# Altium footprint library PIFWRobot.PcbLib: 18 footprints (part 1 of 2)
Each footprint in its own frame and in the unit in brackets; x right, y up, seen from the top. Pads: shape width x height; smd on the part's side, far side on the other; paste and mask are expansions set on the pad; w line width, h text height; cw(c..) or ccw(c..) is an arc to the next point about the centre after c.
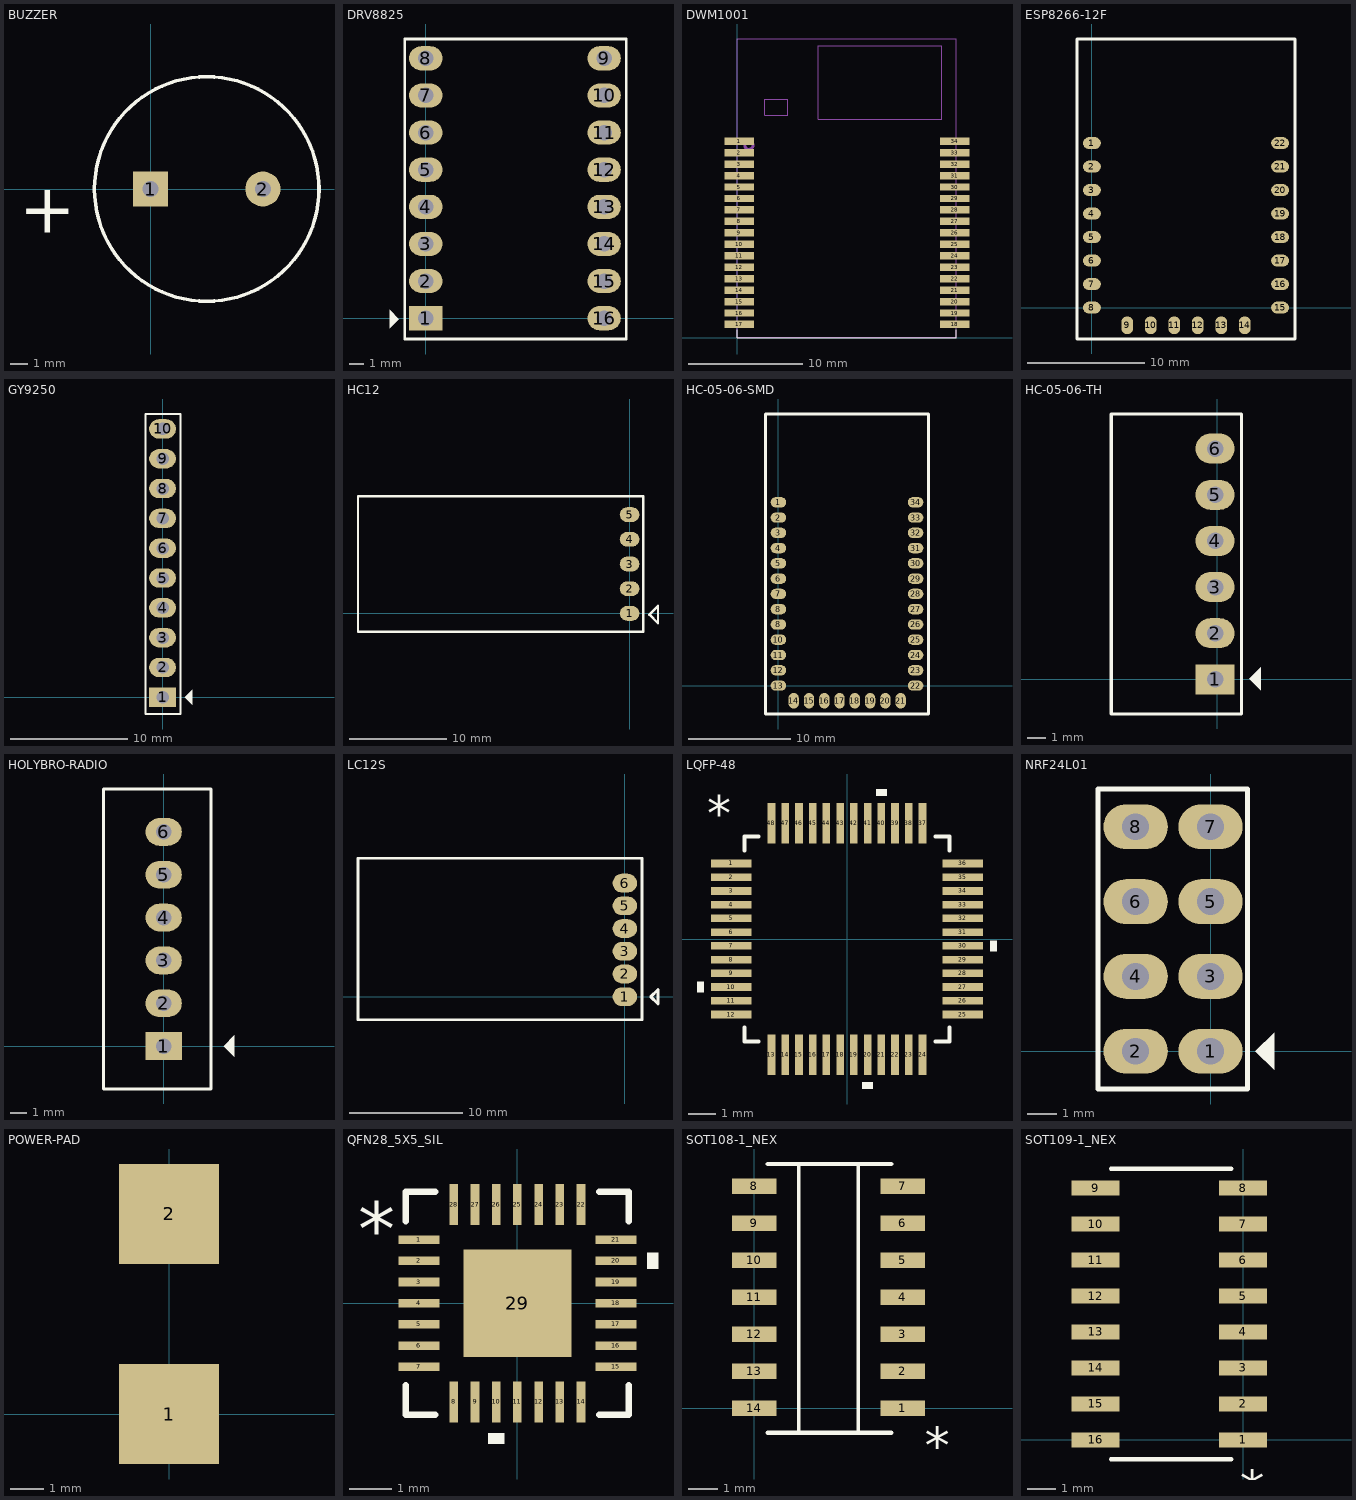
[diagram p0: the footprints below, top view; thin cyan lines are the x and y axes]

## BUZZER [mil]
pads (2):
  rect 80x80 hole 36: 1(0,0)
  round 80 hole 36: 2(255.91,0)
Top Overlay:
  circle w8: c127.95,0 r255.91
  text "+" at -300,-100 h112.5
3D body "Altavoz.STEP": height 225.91, standoff -400.08, extent -108.27,-233.27 358.27,233.27

## DRV8825 [mil]
pads (16):
  rect 90x65 hole 42: 1(0,0)
  oval 90x65 hole 42: 2(0,100) 3(0,200) 4(0,300) 5(0,400) 6(0,500) 7(0,600) 8(0,700) 9(480,700) 10(480,600) 11(480,500) 12(480,400) 13(480,300) 14(480,200) 15(480,100) 16(480,0)
Top Overlay:
  region: -72.5,-2.5 -97.5,22.5 -97.5,-27.5
  lines w7: 423,-56 540,-56 ; 540,-56 540,752 -57,752 -57,-56 540,-56
3D body "Driver DRV8825.stp": height 544.09, standoff -36.36, extent -55.28,-52.64 535.27,747.36

## DWM1001 [mm] "DWM1001 MODULE"
height 4
pads (34):
  rect 2.54x0.65 smd: 1(0.16,17.15) 2(0.16,16.15) 3(0.16,15.15) 4(0.16,14.15) 5(0.16,13.15) 6(0.16,12.15) 7(0.16,11.15) 8(0.16,10.15) 9(0.16,9.15) 10(0.16,8.15) 11(0.16,7.15) 12(0.16,6.15) 13(0.16,5.15) 14(0.16,4.15) 15(0.16,3.15) 16(0.16,2.15) 17(0.16,1.15) 18(18.97,1.15) 19(18.97,2.15) 20(18.97,3.15) 21(18.97,4.15) 22(18.97,5.15) 23(18.97,6.15) 24(18.97,7.15) 25(18.97,8.15) 26(18.97,9.15) 27(18.97,10.15) 28(18.97,11.15) 29(18.97,12.15) 30(18.97,13.15) 31(18.97,14.15) 32(18.97,15.15) 33(18.97,16.15) 34(18.97,17.15)
Top Overlay:
  lines w0.1: 0,0.7 0,0 19.1,0 19.1,0.7
Mechanical 1:
  lines w0.1: 0,0 0,26.075 19.1,26.075 19.1,0.025 0,0.025 0,0.9
Mechanical 16:
  circle w0.254: c1,16.8 r0.361
  lines w0.1: 0,0.025 0,26.075 19.1,26.075 19.1,0.025 0,0.025 ; 2.4,19.4 2.4,20.8 4.4,20.8 4.4,19.4 2.4,19.4 ; 7.075,19.05 7.075,25.475 17.85,25.475 17.85,19.05 7.075,19.05
Mechanical 29:
  text ".Designator" at 5.6,11.6 h0.8
3D body "dm1_b2_V2.step": height 4.6, standoff 0.03, extent 0,0 19.125,26.125

## ESP8266-12F [mil]
pads (22):
  oval 60x40 smd: 1(0,551.18) 2(0,472.44) 3(0,393.7) 4(0,314.96) 5(0,236.22) 6(0,157.48) 7(0,78.74) 8(0,0) 15(630,0) 16(630,78.74) 17(630,157.48) 18(630,236.22) 19(630,314.96) 20(630,393.7) 21(630,472.44) 22(630,551.18)
  oval 40x60 smd: 9(118.11,-59.06) 10(196.85,-59.06) 11(275.59,-59.06) 12(354.33,-59.06) 13(433.07,-59.06) 14(511.81,-59.06)
Top Overlay:
  lines w10: -50,-105 -50,900 680,900 680,-105 -50,-105
3D body "User Library-EPS8266 ESP-12E-1.STEP": height 104.33, standoff -1.38, extent -0.16,-60 630.16,885.08

## GY9250 [mil] "GY9250"
height 200
pads (10):
  rect 90x65 hole 42: 1(0,0)
  oval 90x65 hole 42: 2(0,100) 3(0,200) 4(0,300) 5(0,400) 6(0,500) 7(0,600) 8(0,700) 9(0,800) 10(0,900)
Top Overlay:
  region: 75,0 100,-25 100,25
  lines w7: -57,-56 -57,950 60,950 60,-56 -57,-56
3D body "MPU-9250.stp": height 266.97, standoff -235.99, extent -530.55,-50 60,950

## HC12 [mil]
pads (5):
  oval 80x60 smd: 1(0,0) 2(0,100) 3(0,200) 4(0,300) 5(0,400)
Top Overlay:
  lines w10: -1100,-75 55,-75 55,475 -1100,475 -1100,-75 ; 80,-5 115,-40 115,30 80,-5
3D body "HC-12 SI4463 WIRELESS SERIAL MODULE.STEP": height 78.74, standoff 0, extent -1086.33,-61.81 -3.65,461.81

## HC-05-06-SMD [mil]
pads (34):
  oval 60x40 smd: 1(0,708.66) 2(0,649.61) 3(0,590.55) 4(0,531.5) 5(0,472.44) 6(0,413.39) 7(0,354.33) 8(0,236.22) 8(0,295.28) 10(0,177.17) 11(0,118.11) 12(0,59.06) 13(0,0) 22(530,0) 23(530,59.06) 24(530,118.11) 25(530,177.17) 26(530,236.22) 27(530,295.28) 28(530,354.33) 29(530,413.39) 30(530,472.44) 31(530,531.5) 32(530,590.55) 33(530,649.61) 34(530,708.66)
  oval 40x60 smd: 14(59.06,-59.06) 15(118.11,-59.06) 16(177.17,-59.06) 17(236.22,-59.06) 18(295.28,-59.06) 19(354.33,-59.06) 20(413.39,-59.06) 21(472.44,-59.06)
Top Overlay:
  lines w10: -50,-110 580,-110 580,1050 -50,1050 -50,-110
3D body "User Library-Bluetooth HC-06_.STEP": height 92.52, standoff 0, extent -10,-71.38 541.97,1031.38

## HC-05-06-TH [mil]
pads (6):
  rect 85x65 hole 36: 1(-5,0)
  oval 85x65 hole 36: 2(-5,100) 3(-5,200) 4(-5,300) 5(-5,400) 6(-5,500)
Top Overlay:
  region: 69,1 94,-24 94,26
  lines w7: -230,-75 -230,575 52,575 52,-75 -230,-75
3D body "hc05.STEP": height 1500, standoff -177.17, extent -220,-66.93 12.29,566.93

## HOLYBRO-RADIO [mil] "JP6"
height 200
pads (6):
  rect 85x65 hole 36: 1(0,0)
  oval 85x65 hole 36: 2(0,100) 3(0,200) 4(0,300) 5(0,400) 6(0,500)
Top Overlay:
  region: 140,0 165,-25 165,25
  lines w7: -140,-100 110,-100 110,600 -140,600 -140,-100
3D body "JST - XH - Thru (V) - 6Pin - 2.54mm.stp": height 284, standoff -118, extent -135,-92 95,592

## LC12S [mil]
pads (6):
  oval 85x65 smd: 1(0,0) 2(0,78.74) 3(0,157.48) 4(0,236.22) 5(0,314.96) 6(0,393.7)
Top Overlay:
  lines w10: -925,-80 -925,480 60,480 60,-80 -925,-80 ; 90,0 115,25 115,-25 90,0
3D body "LC12S.STEP": height 78.74, standoff 0, extent -912.32,-69.69 5,469.69

## LQFP-48 [mil]
pads (48):
  rect 58x11 smd: 1(-166,108.27) 2(-166,88.58) 3(-166,68.9) 4(-166,49.21) 5(-166,29.53) 6(-166,9.84) 7(-166,-9.84) 8(-166,-29.53) 9(-166,-49.21) 10(-166,-68.9) 11(-166,-88.58) 12(-166,-108.27) 25(166,-108.27) 26(166,-88.58) 27(166,-68.9) 28(166,-49.21) 29(166,-29.53) 30(166,-9.84) 31(166,9.84) 32(166,29.53) 33(166,49.21) 34(166,68.9) 35(166,88.58) 36(166,108.27)
  rect 11x58 smd: 13(-108.27,-166) 14(-88.58,-166) 15(-68.9,-166) 16(-49.21,-166) 17(-29.53,-166) 18(-9.84,-166) 19(9.84,-166) 20(29.53,-166) 21(49.21,-166) 22(68.9,-166) 23(88.58,-166) 24(108.27,-166) 37(108.27,166) 38(88.58,166) 39(68.9,166) 40(49.21,166) 41(29.53,166) 42(9.84,166) 43(-9.84,166) 44(-29.53,166) 45(-49.21,166) 46(-68.9,166) 47(-88.58,166) 48(-108.27,166)
Top Overlay:
  region: 56.71,205 41.71,205 41.71,215 56.71,215
  region: 205,-2.34 215,-2.34 215,-17.34 205,-17.34
  region: 37.03,-205 22.03,-205 22.03,-215 37.03,-215
  region: -205,-61.4 -215,-61.4 -215,-76.4 -205,-76.4
  lines w6: -147,-126.87 -147,-147 -126.87,-147 ; -147,126.87 -147,147 -126.87,147 ; 126.87,-147 147,-147 147,-126.87 ; 126.87,147 147,147 147,126.87
  text "*" at -200,155 h50
3D body "LQFP-48.step": height 63.11, standoff 0, extent -180.98,-180.98 180.99,180.99
3D body: height 10, standoff 0, extent 0,0 10,10

## NRF24L01 [mil]
pads (8):
  oval 86x60 hole 36: 1(0,0) 2(-100,0) 3(0,100) 4(-100,100) 5(0,200) 6(-100,200) 7(0,300) 8(-100,300)
Top Overlay:
  region: 60,0 85,-25 85,25
  lines w7: -150.5,-50.5 -150.5,350.5 49.5,350.5 49.5,-50.5 -50.5,-50.5 -150.5,-50.5
3D body "NRF24l01_with_antenna.STEP": height 3860.96, standoff -24.41, extent -2826.3,-150.19 87.09,450.21

## POWER-PAD [mm]
pads (2):
  rect 3x3 smd: 1(0,0) 2(0,6)

## QFN28_5X5_SIL [mil]
pads (29):
  rect 38x8 smd: 1(-91.5,59.05) 2(-91.5,39.37) 3(-91.5,19.68) 4(-91.5,0) 5(-91.5,-19.68) 6(-91.5,-39.37) 7(-91.5,-59.06) 15(91.5,-59.06) 16(91.5,-39.37) 17(91.5,-19.68) 18(91.5,0) 19(91.5,19.68) 20(91.5,39.37) 21(91.5,59.06)
  rect 8x38 smd: 8(-59.06,-91.5) 9(-39.37,-91.5) 10(-19.68,-91.5) 11(0,-91.5) 12(19.68,-91.5) 13(39.37,-91.5) 14(59.06,-91.5) 22(59.06,91.5) 23(39.37,91.5) 24(19.68,91.5) 25(0,91.5) 26(-19.68,91.5) 27(-39.37,91.5) 28(-59.06,91.5)
  rect 100x100 smd paste-65.5 mask+0: 29(0,0)
Top Overlay:
  region: 120.5,46.87 130.5,46.87 130.5,31.87 120.5,31.87
  region: -12.19,-120.5 -27.18,-120.5 -27.18,-130.5 -12.19,-130.5
  lines w6: -103.5,-76.16 -103.5,-103.5 -76.16,-103.5 ; -103.5,76.16 -103.5,103.5 -76.16,103.5 ; 76.16,-103.5 103.5,-103.5 103.5,-76.16 ; 76.16,103.5 103.5,103.5 103.5,76.16
  text "*" at -148,43.9 h50
Top Paste:
  region: 50,-3.94 3.94,-3.94 3.94,-50 50,-50
  region: 50,50 3.94,50 3.94,3.94 50,3.94
  region: -3.94,-3.94 -50,-3.94 -50,-50 -3.94,-50
  region: -3.94,50 -50,50 -50,3.94 -3.94,3.94
3D body "QFN28_5X5_SIL.step": height 37.09, standoff 0, extent -98,-98 99,99
3D body: height 10, standoff 0, extent 0,0 10,10

## SOT108-1_NEX [mil]
pads (14):
  rect 60x21 smd: 1(200,0) 2(200,50) 3(200,100) 4(200,150) 5(200,200) 6(200,250) 7(200,300) 8(0,300) 9(0,250) 10(0,200) 11(0,150) 12(0,100) 13(0,50) 14(0,0)
Top Overlay:
  lines w5: 60,-33 60,330 ; 140,-33 140,330
  lines w6: 18,-33 185,-33 ; 18,330 185,330
  text "*" at 230,-75 h50
3D body "SOT108-1_NEX.step": height 69.09, standoff 0, extent -22,-22 222.01,322.01

## SOT109-1_NEX [mil]
pads (16):
  rect 67x21 smd: 1(0,0) 2(0,50) 3(0,100) 4(0,150) 5(0,200) 6(0,250) 7(0,300) 8(0,350) 9(-205,350) 10(-205,300) 11(-205,250) 12(-205,200) 13(-205,150) 14(-205,100) 15(-205,50) 16(-205,0)
Top Overlay:
  lines w6: -183.5,-27 -16.5,-27 ; -183.5,377 -16.5,377
  text "*" at 30,-21 h50
3D body: height 10, standoff 0, extent -112.5,165 -102.5,175
3D body "SOT109-1_NEX.step": height 69.09, standoff 0, extent -224.01,-22.01 20.01,372.01